# Altium footprint library PcbLibLafe.PcbLib: 294 footprints (part 2 of 19)
Each footprint in its own frame and in the unit in brackets; x right, y up, seen from the top. Pads: shape width x height; smd on the part's side, far side on the other; paste and mask are expansions set on the pad; w line width, h text height; cw(c..) or ccw(c..) is an arc to the next point about the centre after c.
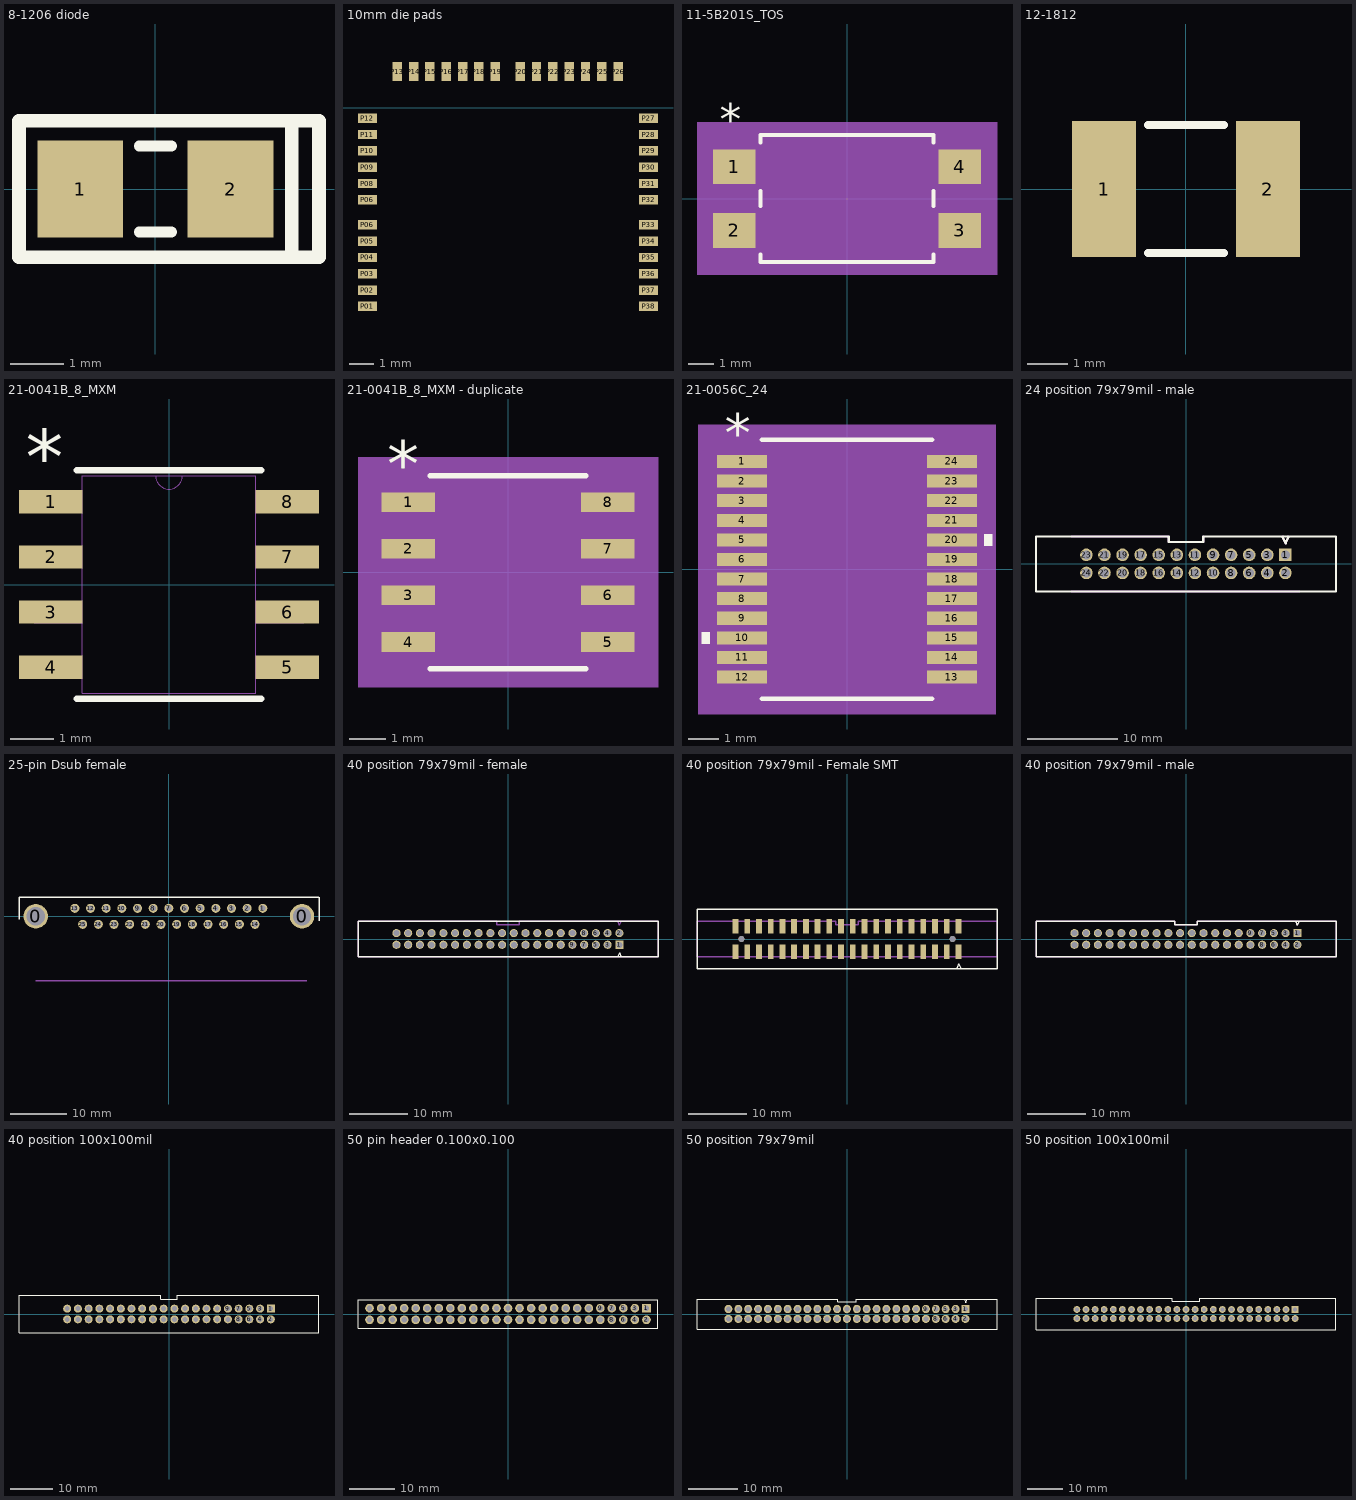
[diagram p1: the footprints below, top view; thin cyan lines are the x and y axes]

## 8-1206 diode [mm] "Chip diode Body 3.1 x 1.6 mm (LxW typ)"
height 0.7
pads (2):
  rect 1.6x1.8 smd: 1(-1.4,0) 2(1.4,0)
Top Overlay:
  lines w0.2: -0.3,-0.8 0.3,-0.8 ; -0.3,0.8 0.3,0.8
  lines w0.254: 2.54,-1.27 3.048,-1.27 3.048,1.27 2.54,1.27 ; 2.54,-1.27 -2.54,-1.27 -2.54,1.27 2.54,1.27 ; 2.54,-1.27 2.54,1.27

## 10mm die pads [mil]
pads (38):
  rect 30x15 smd paste+0 mask+0: P01(1686.98,-315.42) P02(1686.98,-289.52) P03(1686.98,-263.62) P04(1686.98,-237.72) P05(1686.98,-211.82) P06(1686.98,-185.92) P06(1686.98,-146.32) P08(1686.98,-120.42) P09(1686.98,-94.52) P10(1686.98,-68.62) P11(1686.98,-42.72) P12(1686.98,-16.82) P27(2132.73,-16.82) P28(2132.73,-42.72) P29(2132.73,-68.62) P30(2132.73,-94.52) P31(2132.73,-120.42) P32(2132.73,-146.32) P33(2132.73,-185.92) P34(2132.73,-211.82) P35(2132.73,-237.72) P36(2132.73,-263.62) P37(2132.73,-289.52) P38(2132.73,-315.42)
  rect 15x30 smd paste+0 mask+0: P13(1734.16,57.18) P14(1760.06,57.18) P15(1785.96,57.18) P16(1811.86,57.18) P17(1837.76,57.18) P18(1863.66,57.18) P19(1889.56,57.18) P20(1929.16,57.18) P21(1955.06,57.18) P22(1980.96,57.18) P23(2006.86,57.18) P24(2032.76,57.18) P25(2058.66,57.18) P26(2084.56,57.18)

## 11-5B201S_TOS [mil]
pads (4):
  rect 67x55 smd paste+0 mask+0: 1(-177.5,50) 2(-177.5,-50) 3(177.5,-50) 4(177.5,50)
Top Overlay:
  lines w6: -136,-87.87 -136,-100 136,-100 136,-87.87 ; -136,-12.13 -136,12.13 ; -136,87.87 -136,100 136,100 136,87.87 ; 136,-12.13 136,12.13
  text "*" at -200,100 h50
Mechanical 5:
  region: 236,-120 -236,-120 -236,120 236,120
Mechanical 13:
  lines w0: -12,95 ccw(c0,95) 12,95
  lines w1: -197,-76.5 -131,-76.5 -131,-23.5 -197,-23.5 -197,-76.5 ; -197,23.5 -131,23.5 -131,76.5 -197,76.5 -197,23.5 ; -131,-95 -131,95 131,95 131,-95 -131,-95 ; 131,-76.5 197,-76.5 197,-23.5 131,-23.5 131,-76.5 ; 131,23.5 197,23.5 197,76.5 131,76.5 131,23.5
  text "*" at -128.5,42 h50
Mechanical 15:
  region: -141,-87.5 -221,-87.5 -221,87.5 -141,87.5 -141,105 141,105 141,87.5 221,87.5 221,-87.5 141,-87.5 141,-105 -141,-105
  lines w6: -221,-87.5 -141,-87.5 -141,-105 141,-105 141,-87.5 221,-87.5 221,87.5 141,87.5 141,105 -141,105 -141,87.5 -221,87.5 -221,-87.5
3D body: height 10, standoff 0, extent 0,0 10,10

## 12-1812 [mm] "Chip Resistor; Body 4.5 x 3.2 mm (LxW typ)"
height 0.7
pads (2):
  rect 1.6x3.4 smd: 1(-2.05,0) 2(2.05,0)
Top Overlay:
  lines w0.2: -0.95,-1.6 0.95,-1.6 ; -0.95,1.6 0.95,1.6

## 21-0041B_8_MXM [mil]
pads (8):
  rect 57.5x21 smd paste+0 mask+0: 1(-107.25,75) 2(-107.25,25) 3(-107.25,-25) 4(-107.25,-75) 5(107.25,-75) 6(107.25,-25) 7(107.25,25) 8(107.25,75)
Top Overlay:
  lines w6: -83.5,-103.5 83.5,-103.5 ; -83.5,103.5 83.5,103.5
  text "*" at -129.75,91 h50
Mechanical 13:
  lines w0: -12,98.5 ccw(c0,98.5) 12,98.5
  lines w1: -122,-84.5 -122,-65.5 -78.5,-65.5 -78.5,-84.5 -122,-84.5 ; -122,-34.5 -122,-15.5 -78.5,-15.5 -78.5,-34.5 -122,-34.5 ; -122,15.5 -122,34.5 -78.5,34.5 -78.5,15.5 -122,15.5 ; -122,65.5 -122,84.5 -78.5,84.5 -78.5,65.5 -122,65.5 ; -78.5,-98.5 78.5,-98.5 78.5,98.5 -78.5,98.5 -78.5,-98.5 ; 78.5,-84.5 78.5,-65.5 122,-65.5 122,-84.5 78.5,-84.5 ; 78.5,-34.5 78.5,-15.5 122,-15.5 122,-34.5 78.5,-34.5 ; 78.5,15.5 78.5,34.5 122,34.5 122,15.5 78.5,15.5 ; 78.5,65.5 78.5,84.5 122,84.5 122,65.5 78.5,65.5
  text "*" at -76,45.5 h50
3D body "21-0041B_8_MXM.step": height 69.09, standoff 0, extent -122,-98.5 122.01,98.51
3D body: height 10, standoff 0, extent 0,0 10,10

## 21-0041B_8_MXM - duplicate [mil]
pads (8):
  rect 57.5x21 smd paste+0 mask+0: 1(-107.25,75) 2(-107.25,25) 3(-107.25,-25) 4(-107.25,-75) 5(107.25,-75) 6(107.25,-25) 7(107.25,25) 8(107.25,75)
Top Overlay:
  lines w6: -83.5,-103.5 83.5,-103.5 ; -83.5,103.5 83.5,103.5
  text "*" at -129.75,91 h50
Mechanical 5:
  region: 161,-123.5 -161,-123.5 -161,123.5 161,123.5
Mechanical 13:
  lines w0: -12,98.5 ccw(c0,98.5) 12,98.5
  lines w1: -122,-84.5 -78.5,-84.5 -78.5,-65.5 -122,-65.5 -122,-84.5 ; -122,-34.5 -78.5,-34.5 -78.5,-15.5 -122,-15.5 -122,-34.5 ; -122,15.5 -78.5,15.5 -78.5,34.5 -122,34.5 -122,15.5 ; -122,65.5 -78.5,65.5 -78.5,84.5 -122,84.5 -122,65.5 ; -78.5,-98.5 -78.5,98.5 78.5,98.5 78.5,-98.5 -78.5,-98.5 ; 78.5,-84.5 122,-84.5 122,-65.5 78.5,-65.5 78.5,-84.5 ; 78.5,-34.5 122,-34.5 122,-15.5 78.5,-15.5 78.5,-34.5 ; 78.5,15.5 122,15.5 122,34.5 78.5,34.5 78.5,15.5 ; 78.5,65.5 122,65.5 122,84.5 78.5,84.5 78.5,65.5
  text "*" at -76,45.5 h50
Mechanical 15:
  region: -88.5,-95.5 -146,-95.5 -146,95.5 -88.5,95.5 -88.5,108.5 88.5,108.5 88.5,95.5 146,95.5 146,-95.5 88.5,-95.5 88.5,-108.5 -88.5,-108.5
  lines w6: -146,-95.5 -88.5,-95.5 -88.5,-108.5 88.5,-108.5 88.5,-95.5 146,-95.5 146,95.5 88.5,95.5 88.5,108.5 -88.5,108.5 -88.5,95.5 -146,95.5 -146,-95.5
3D body "21-0041B_8_MXM.step": height 69.09, standoff 0, extent -122.01,-98.5 122.01,98.5

## 21-0056C_24 [mil]
pads (24):
  rect 65x17 smd: 1(-137,140.75) 2(-137,115.16) 3(-137,89.57) 4(-137,63.98) 5(-137,38.39) 6(-137,12.8) 7(-137,-12.8) 8(-137,-38.39) 9(-137,-63.98) 10(-137,-89.57) 11(-137,-115.16) 12(-137,-140.75) 13(137,-140.75) 14(137,-115.16) 15(137,-89.57) 16(137,-63.98) 17(137,-38.39) 18(137,-12.8) 19(137,12.8) 20(137,38.39) 21(137,63.98) 22(137,89.57) 23(137,115.16) 24(137,140.75)
Top Overlay:
  region: 179.5,45.89 189.5,45.89 189.5,30.89 179.5,30.89
  region: -179.5,-82.07 -189.5,-82.07 -189.5,-97.07 -179.5,-97.07
  lines w6: -111,-169 111,-169 ; -111,169 111,169
  text "*" at -159.5,152.75 h50
Mechanical 5:
  region: 194.5,-189 -194.5,-189 -194.5,189 194.5,189
Mechanical 13:
  lines w0: -12,164 ccw(c0,164) 12,164
  lines w1: -155.5,-148.25 -106,-148.25 -106,-133.25 -155.5,-133.25 -155.5,-148.25 ; -155.5,-122.66 -106,-122.66 -106,-107.66 -155.5,-107.66 -155.5,-122.66 ; -155.5,-97.07 -106,-97.07 -106,-82.07 -155.5,-82.07 -155.5,-97.07 ; -155.5,-71.48 -106,-71.48 -106,-56.48 -155.5,-56.48 -155.5,-71.48 ; -155.5,-45.89 -106,-45.89 -106,-30.89 -155.5,-30.89 -155.5,-45.89 ; -155.5,-20.3 -106,-20.3 -106,-5.3 -155.5,-5.3 -155.5,-20.3 ; -155.5,5.3 -106,5.3 -106,20.3 -155.5,20.3 -155.5,5.3 ; -155.5,30.89 -106,30.89 -106,45.89 -155.5,45.89 -155.5,30.89 ; -155.5,56.48 -106,56.48 -106,71.48 -155.5,71.48 -155.5,56.48 ; -155.5,82.07 -106,82.07 -106,97.07 -155.5,97.07 -155.5,82.07 ; -155.5,107.66 -106,107.66 -106,122.66 -155.5,122.66 -155.5,107.66 ; -155.5,133.25 -106,133.25 -106,148.25 -155.5,148.25 -155.5,133.25 ; -106,-164 -106,164 106,164 106,-164 -106,-164 ; 106,-148.25 155.5,-148.25 155.5,-133.25 106,-133.25 106,-148.25 ; 106,-122.66 155.5,-122.66 155.5,-107.66 106,-107.66 106,-122.66 ; 106,-97.07 155.5,-97.07 155.5,-82.07 106,-82.07 106,-97.07 ; 106,-71.48 155.5,-71.48 155.5,-56.48 106,-56.48 106,-71.48 ; 106,-45.89 155.5,-45.89 155.5,-30.89 106,-30.89 106,-45.89 ; 106,-20.3 155.5,-20.3 155.5,-5.3 106,-5.3 106,-20.3 ; 106,5.3 155.5,5.3 155.5,20.3 106,20.3 106,5.3 ; 106,30.89 155.5,30.89 155.5,45.89 106,45.89 106,30.89 ; 106,56.48 155.5,56.48 155.5,71.48 106,71.48 106,56.48 ; 106,82.07 155.5,82.07 155.5,97.07 106,97.07 106,82.07 ; 106,107.66 155.5,107.66 155.5,122.66 106,122.66 106,107.66 ; 106,133.25 155.5,133.25 155.5,148.25 106,148.25 106,133.25
  text "*" at -103.5,111 h50
Mechanical 15:
  region: -116,-159.25 -179.5,-159.25 -179.5,159.25 -116,159.25 -116,174 116,174 116,159.25 179.5,159.25 179.5,-159.25 116,-159.25 116,-174 -116,-174
  lines w6: -179.5,-159.25 -116,-159.25 -116,-174 116,-174 116,-159.25 179.5,-159.25 179.5,159.25 116,159.25 116,174 -116,174 -116,159.25 -179.5,159.25 -179.5,-159.25
3D body "21-0056C_24.step": height 78.11, standoff 0, extent -155.51,-164.02 155.51,164.02

## 24 position 79x79mil - male [mil] "24 position 79x79mil ribbon cable header"
pads (24):
  rect 55x55 hole 40: 1(434,40)
  round 55 hole 40: 2(434,-39) 3(355,40) 4(355,-39) 5(276,40) 6(276,-39) 7(197,40) 8(197,-39) 9(118,40) 10(118,-39) 11(39,40) 12(39,-39) 13(-40,40) 14(-40,-39) 15(-119,40) 16(-119,-39) 17(-198,40) 18(-198,-39) 19(-277,40) 20(-277,-39) 21(-356,40) 22(-356,-39) 23(-435,40) 24(-435,-39)
Top Overlay:
  lines w10: 422,119 435,91 447,119 ; -655,-120 655,-120 655,120 75,120 75,96 -75,96 -75,120 -655,120 -655,-120
Mechanical 40:
  lines w10: -500,-120 492,-120 ; -500,120 -75,120 -75,96 75,96 75,120 ; 422,119 435,91 447,119

## 25-pin Dsub female [mm] "25-pin Dsub Female"
pads (27):
  round 4.318 hole 3.251 unplated: 0(-23.55,0) 0(23.55,0)
  round 1.6 hole 1: 1(16.62,1.42) 2(13.85,1.42) 3(11.08,1.42) 4(8.31,1.42) 5(5.54,1.42) 6(2.77,1.42) 7(0,1.42) 8(-2.77,1.42) 9(-5.54,1.42) 10(-8.31,1.42) 11(-11.08,1.42) 12(-13.85,1.42) 13(-16.62,1.42) 14(15.24,-1.42) 15(12.47,-1.42) 16(9.7,-1.42) 17(6.93,-1.42) 18(4.16,-1.42) 19(1.39,-1.42) 20(-1.39,-1.42) 21(-4.16,-1.42) 22(-6.93,-1.42) 23(-9.7,-1.42) 24(-12.47,-1.42) 25(-15.24,-1.42)
Top Overlay:
  lines w0.254: -26.5,-0.508 -26.5,3.4 26.5,3.4 ; 26.55,-0.762 26.55,3.33
Mechanical 3:
  lines w0.254: -23.5,-11.42 24.4,-11.42
3D body "c-1-106507-2-j-3d.stp": height 13.35, standoff -3.6, extent -26.545,-17.621 26.595,3.629

## 40 position 79x79mil - female [mil] "40 position 79x79mil - female"
pads (40):
  rect 55x55 hole 40: 1(750,-39)
  round 55 hole 40: 2(750,40) 3(671,-39) 4(671,40) 5(592,-39) 6(592,40) 7(513,-39) 8(513,40) 9(434,-39) 10(434,40) 11(355,-39) 12(355,40) 13(276,-39) 14(276,40) 15(197,-39) 16(197,40) 17(118,-39) 18(118,40) 19(39,-39) 20(39,40) 21(-40,-39) 22(-40,40) 23(-119,-39) 24(-119,40) 25(-198,-39) 26(-198,40) 27(-277,-39) 28(-277,40) 29(-356,-39) 30(-356,40) 31(-435,-39) 32(-435,40) 33(-514,-39) 34(-514,40) 35(-593,-39) 36(-593,40) 37(-672,-39) 38(-672,40) 39(-751,-39) 40(-751,40)
Top Overlay:
  lines w10: -1010,118 -1010,-120 1010,-120 1010,120 75,120 -75,120 -1010,120 ; 739,-119 751,-91 764,-119
Mechanical 40:
  lines w10: -1010,118 -1010,-120 1010,-120 1010,120 75,120 75,96 -75,96 -75,120 -1010,120 ; 737.5,119 750.5,91 762.5,119
3D body "T2M-120-01-L-D-TH-WT.stp": height 213.98, standoff -130.91, extent -900.59,-154.26 897.59,138.77

## 40 position 79x79mil - Female SMT [mil] "40 position 79x79mil"
pads (42):
  rect 39x98 smd: 1(750,-87) 2(750,87) 3(671,-87) 4(671,87) 5(592,-87) 6(592,87) 7(513,-87) 8(513,87) 9(434,-87) 10(434,87) 11(355,-87) 12(355,87) 13(276,-87) 14(276,87) 15(197,-87) 16(197,87) 17(118,-87) 18(118,87) 19(39,-87) 20(39,87) 21(-40,-87) 22(-40,87) 23(-119,-87) 24(-119,87) 25(-198,-87) 26(-198,87) 27(-277,-87) 28(-277,87) 29(-356,-87) 30(-356,87) 31(-435,-87) 32(-435,87) 33(-514,-87) 34(-514,87) 35(-593,-87) 36(-593,87) 37(-672,-87) 38(-672,87) 39(-751,-87) 40(-751,87)
  round 39 hole 40: ""(-711,0) ""(711,0)
Top Overlay:
  lines w10: 741.5,-194 753.5,-166 766.5,-194 ; -1010,-200 -1010,200 -75,200 75,200 1010,200 1010,-200 -1010,-200
Mechanical 40:
  lines w10: -1010,118 -1010,-120 1010,-120 1010,120 75,120 75,96 -75,96 -75,120 -1010,120 ; 737.5,119 750.5,91 762.5,119
3D body "155240-6XX0.stp": height 408, standoff -87, extent -1005.15,-161.5 1006.15,158.5

## 40 position 79x79mil - male [mil] "40 position 79x79mil"
pads (40):
  rect 55x55 hole 40: 1(750,40)
  round 55 hole 40: 2(750,-39) 3(671,40) 4(671,-39) 5(592,40) 6(592,-39) 7(513,40) 8(513,-39) 9(434,40) 10(434,-39) 11(355,40) 12(355,-39) 13(276,40) 14(276,-39) 15(197,40) 16(197,-39) 17(118,40) 18(118,-39) 19(39,40) 20(39,-39) 21(-40,40) 22(-40,-39) 23(-119,40) 24(-119,-39) 25(-198,40) 26(-198,-39) 27(-277,40) 28(-277,-39) 29(-356,40) 30(-356,-39) 31(-435,40) 32(-435,-39) 33(-514,40) 34(-514,-39) 35(-593,40) 36(-593,-39) 37(-672,40) 38(-672,-39) 39(-751,40) 40(-751,-39)
Top Overlay:
  lines w10: -1010,118 -1010,-120 1010,-120 1010,120 75,120 75,96 -75,96 -75,120 -1010,120 ; 737.5,119 750.5,91 762.5,119
Mechanical 40:
  lines w10: -1010,118 -1010,-120 1010,-120 1010,120 75,120 75,96 -75,96 -75,120 -1010,120 ; 737.5,119 750.5,91 762.5,119
3D body "155240-6XX0.stp": height 358, standoff -137, extent -1000.35,-155.2 1010.95,164.8

## 40 position 100x100mil [mil] "40 position 100x100mil"
pads (40):
  rect 75x75 hole 45: 1(950,50)
  round 75 hole 45: 2(950,-50) 3(850,50) 4(850,-50) 5(750,50) 6(750,-50) 7(650,50) 8(650,-50) 9(550,50) 10(550,-50) 11(450,50) 12(450,-50) 13(350,50) 14(350,-50) 15(250,50) 16(250,-50) 17(150,50) 18(150,-50) 19(50,50) 20(50,-50) 21(-50,50) 22(-50,-50) 23(-150,50) 24(-150,-50) 25(-250,50) 26(-250,-50) 27(-350,50) 28(-350,-50) 29(-450,50) 30(-450,-50) 31(-550,50) 32(-550,-50) 33(-650,50) 34(-650,-50) 35(-750,50) 36(-750,-50) 37(-850,50) 38(-850,-50) 39(-950,50) 40(-950,-50)
Top Overlay:
  lines w10: -1400,-175 -1400,175 -75,175 -75,140 75,140 75,175 1400,175 1400,-175 -1400,-175

## 50 pin header 0.100x0.100 [mil] "thro hole"
pads (50):
  rect 75x75 hole 45: 1(1200,50)
  round 75 hole 45: 2(1200,-50) 3(1100,50) 4(1100,-50) 5(1000,50) 6(1000,-50) 7(900,50) 8(900,-50) 9(800,50) 10(800,-50) 11(700,50) 12(700,-50) 13(600,50) 14(600,-50) 15(500,50) 16(500,-50) 17(400,50) 18(400,-50) 19(300,50) 20(300,-50) 21(200,50) 22(200,-50) 23(100,50) 24(100,-50) 25(0,50) 26(0,-50) 27(-100,50) 28(-100,-50) 29(-200,50) 30(-200,-50) 31(-300,50) 32(-300,-50) 33(-400,50) 34(-400,-50) 35(-500,50) 36(-500,-50) 37(-600,50) 38(-600,-50) 39(-700,50) 40(-700,-50) 41(-800,50) 42(-800,-50) 43(-900,50) 44(-900,-50) 45(-1000,50) 46(-1000,-50) 47(-1100,50) 48(-1100,-50) 49(-1200,50) 50(-1200,-50)
Top Overlay:
  lines w10: -1300,-125 -1300,125 1300,125 1300,-125 -1300,-125
3D body "50 pin header.SLDPRT": height 325, standoff -112, extent -1250,-100 1250,100

## 50 position 79x79mil [mil] "50 position 79x79mil"
pads (50):
  rect 65x65 hole 40: 1(947.5,40)
  round 65 hole 40: 2(947.5,-39) 3(868.5,40) 4(868.5,-39) 5(789.5,40) 6(789.5,-39) 7(710.5,40) 8(710.5,-39) 9(631.5,40) 10(631.5,-39) 11(552.5,40) 12(552.5,-39) 13(473.5,40) 14(473.5,-39) 15(394.5,40) 16(394.5,-39) 17(315.5,40) 18(315.5,-39) 19(236.5,40) 20(236.5,-39) 21(157.5,40) 22(157.5,-39) 23(78.5,40) 24(78.5,-39) 25(-0.5,40) 26(-0.5,-39) 27(-79.5,40) 28(-79.5,-39) 29(-158.5,40) 30(-158.5,-39) 31(-237.5,40) 32(-237.5,-39) 33(-316.5,40) 34(-316.5,-39) 35(-395.5,40) 36(-395.5,-39) 37(-474.5,40) 38(-474.5,-39) 39(-553.5,40) 40(-553.5,-39) 41(-632.5,40) 42(-632.5,-39) 43(-711.5,40) 44(-711.5,-39) 45(-790.5,40) 46(-790.5,-39) 47(-869.5,40) 48(-869.5,-39) 49(-948.5,40) 50(-948.5,-39)
Top Overlay:
  lines w10: -1200,118 -1200,-120 1200,-120 1200,120 75,120 75,96.5 -75,96.5 -75,120 -1200,120 ; 937.5,118.5 950.5,90.5 962.5,118.5

## 50 position 100x100mil [mil] "50 position 100x100mil"
pads (50):
  rect 75x75 hole 45: 1(1200,50)
  round 75 hole 45: 2(1200,-50) 3(1100,50) 4(1100,-50) 5(1000,50) 6(1000,-50) 7(900,50) 8(900,-50) 9(800,50) 10(800,-50) 11(700,50) 12(700,-50) 13(600,50) 14(600,-50) 15(500,50) 16(500,-50) 17(400,50) 18(400,-50) 19(300,50) 20(300,-50) 21(200,50) 22(200,-50) 23(100,50) 24(100,-50) 25(0,50) 26(0,-50) 27(-100,50) 28(-100,-50) 29(-200,50) 30(-200,-50) 31(-300,50) 32(-300,-50) 33(-400,50) 34(-400,-50) 35(-500,50) 36(-500,-50) 37(-600,50) 38(-600,-50) 39(-700,50) 40(-700,-50) 41(-800,50) 42(-800,-50) 43(-900,50) 44(-900,-50) 45(-1000,50) 46(-1000,-50) 47(-1100,50) 48(-1100,-50) 49(-1200,50) 50(-1200,-50)
Top Overlay:
  lines w10: -1650,-175 1650,-175 1650,175 150,175 150,140 -150,140 -150,175 -1650,175 -1650,-175